# Altium footprint library Lib_001.PcbLib: 429 footprints (part 25 of 28)
Each footprint in its own frame and in the unit in brackets; x right, y up, seen from the top. Pads: shape width x height; smd on the part's side, far side on the other; paste and mask are expansions set on the pad; w line width, h text height; cw(c..) or ccw(c..) is an arc to the next point about the centre after c.
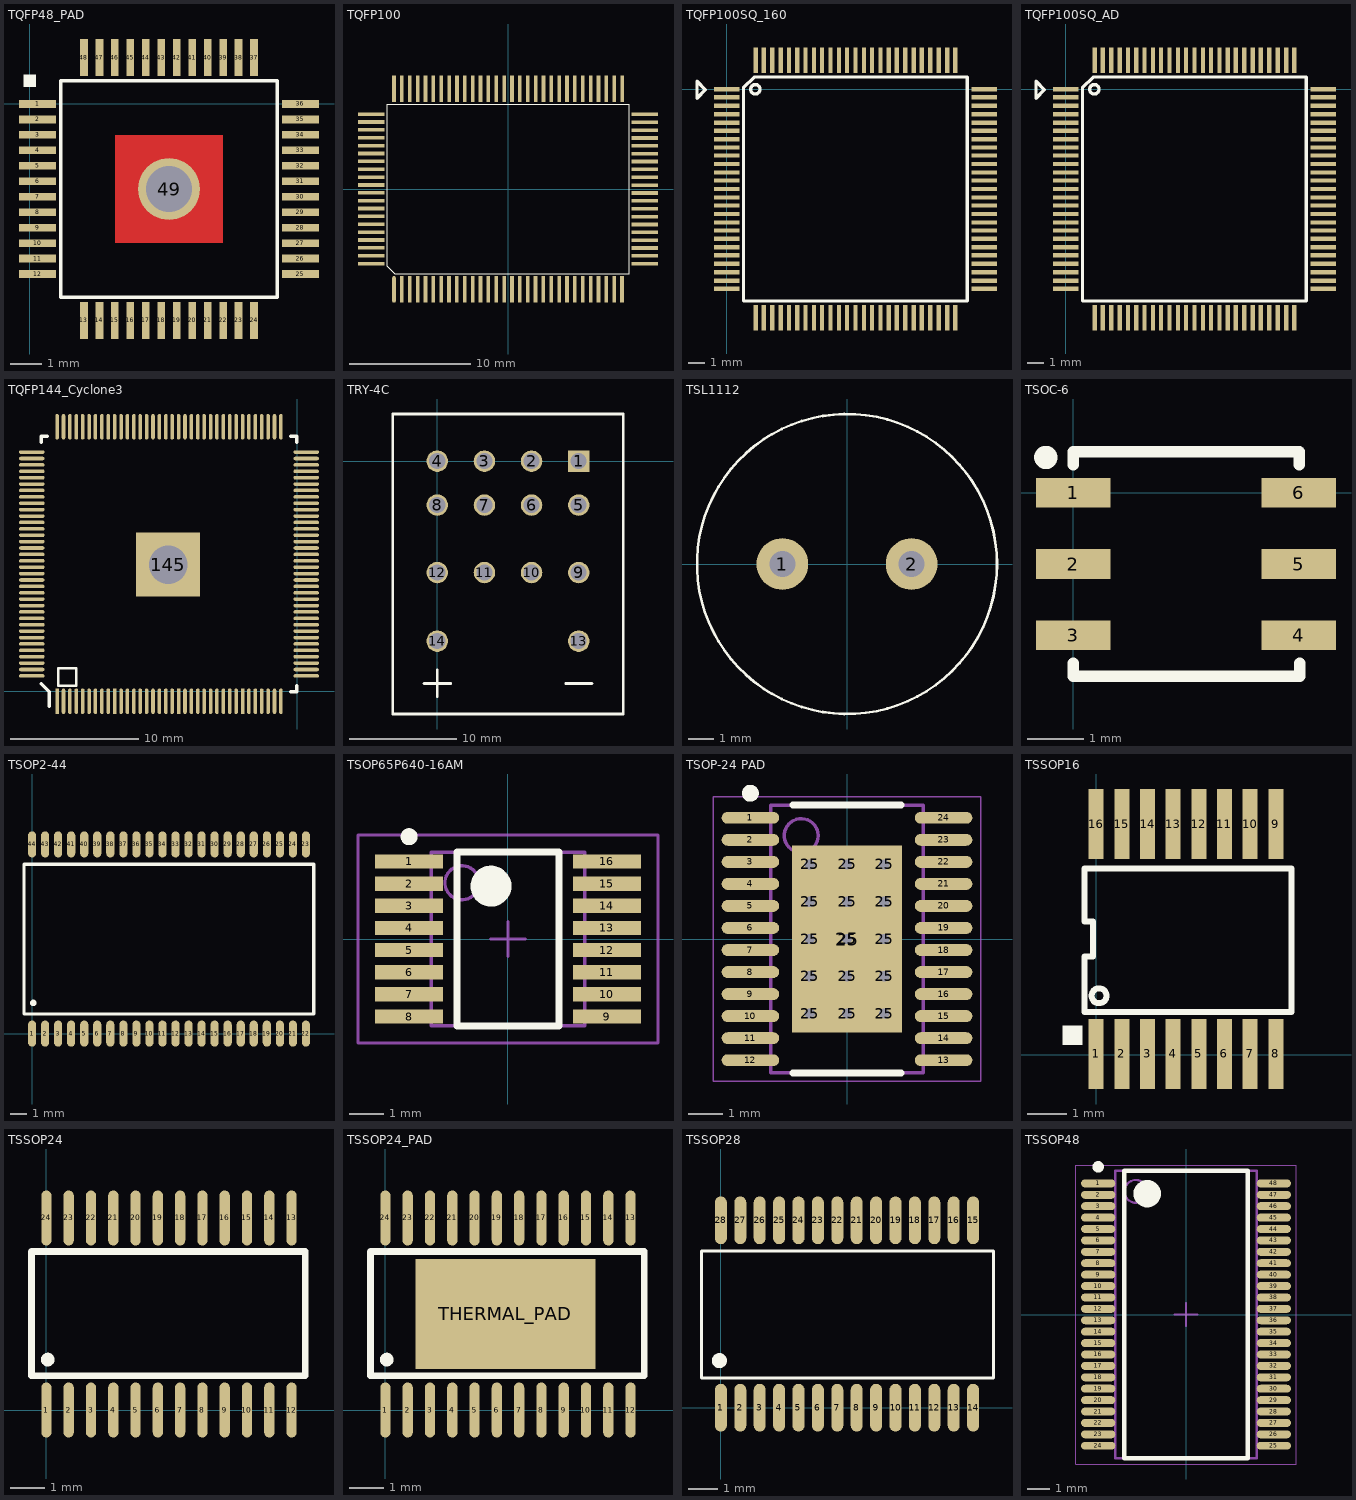
[diagram p24: the footprints below, top view; thin cyan lines are the x and y axes]

## TQFP48_PAD [mm] "TQFP 48 Leads with Exposed Pad"
height 1.2
pads (49):
  rect 1.2x0.25 smd: 1(0.25,0) 2(0.25,-0.5) 3(0.25,-1) 4(0.25,-1.5) 5(0.25,-2) 6(0.25,-2.5) 7(0.25,-3) 8(0.25,-3.5) 9(0.25,-4) 10(0.25,-4.5) 11(0.25,-5) 12(0.25,-5.5) 25(8.75,-5.5) 26(8.75,-5) 27(8.75,-4.5) 28(8.75,-4) 29(8.75,-3.5) 30(8.75,-3) 31(8.75,-2.5) 32(8.75,-2) 33(8.75,-1.5) 34(8.75,-1) 35(8.75,-0.5) 36(8.75,0)
  rect 0.25x1.2 smd: 13(1.75,-7) 14(2.25,-7) 15(2.75,-7) 16(3.25,-7) 17(3.75,-7) 18(4.25,-7) 19(4.75,-7) 20(5.25,-7) 21(5.75,-7) 22(6.25,-7) 23(6.75,-7) 24(7.25,-7) 37(7.25,1.5) 38(6.75,1.5) 39(6.25,1.5) 40(5.75,1.5) 41(5.25,1.5) 42(4.75,1.5) 43(4.25,1.5) 44(3.75,1.5) 45(3.25,1.5) 46(2.75,1.5) 47(2.25,1.5) 48(1.75,1.5)
  round 2 hole 1.5: 49(4.5,-2.75)
Top Layer:
  rectangle: 2.75,-4.5 6.25,-1
Top Overlay:
  rectangle: -0.2,0.55 0.2,0.95
  lines w0.1: 1,-6.25 1,0.75 8,0.75 8,-6.25 1,-6.25
3D body "TQFP48_PAD.STEP": height 1.1, standoff 0, extent 0,-7.25 9,1.75

## TQFP100 [mm]
pads (100):
  oval 0.3x2.2 smd: 1(-9.423,-8.3)
  rect 0.3x2.2 smd: 2(-8.773,-8.3) 3(-8.123,-8.3) 4(-7.473,-8.3) 5(-6.823,-8.3) 6(-6.173,-8.3) 7(-5.523,-8.3) 8(-4.873,-8.3) 9(-4.223,-8.3) 10(-3.573,-8.3) 11(-2.923,-8.3) 12(-2.273,-8.3) 13(-1.623,-8.3) 14(-0.973,-8.3) 15(-0.323,-8.3) 16(0.327,-8.3) 17(0.977,-8.3) 18(1.627,-8.3) 19(2.277,-8.3) 20(2.927,-8.3) 21(3.577,-8.3) 22(4.227,-8.3) 23(4.877,-8.3) 24(5.527,-8.3) 25(6.177,-8.3) 26(6.827,-8.3) 27(7.477,-8.3) 28(8.127,-8.3) 29(8.777,-8.3) 30(9.427,-8.3) 51(9.43,8.3) 52(8.78,8.3) 53(8.13,8.3) 54(7.48,8.3) 55(6.83,8.3) 56(6.18,8.3) 57(5.53,8.3) 58(4.88,8.3) 59(4.23,8.3) 60(3.58,8.3) 61(2.93,8.3) 62(2.28,8.3) 63(1.63,8.3) 64(0.98,8.3) 65(0.33,8.3) 66(-0.32,8.3) 67(-0.97,8.3) 68(-1.62,8.3) 69(-2.27,8.3) 70(-2.92,8.3) 71(-3.57,8.3) 72(-4.22,8.3) 73(-4.87,8.3) 74(-5.52,8.3) 75(-6.17,8.3) 76(-6.82,8.3) 77(-7.47,8.3) 78(-8.12,8.3) 79(-8.77,8.3) 80(-9.42,8.3)
  rect 2.2x0.3 smd: 31(11.3,-6.18) 32(11.3,-5.53) 33(11.3,-4.88) 34(11.3,-4.23) 35(11.3,-3.58) 36(11.3,-2.93) 37(11.3,-2.28) 38(11.3,-1.63) 39(11.3,-0.98) 40(11.3,-0.33) 41(11.3,0.32) 42(11.3,0.97) 43(11.3,1.62) 44(11.3,2.27) 45(11.3,2.92) 46(11.3,3.57) 47(11.3,4.22) 48(11.3,4.87) 49(11.3,5.52) 50(11.3,6.17) 81(-11.3,6.185) 82(-11.3,5.535) 83(-11.3,4.885) 84(-11.3,4.235) 85(-11.3,3.585) 86(-11.3,2.935) 87(-11.3,2.285) 88(-11.3,1.635) 89(-11.3,0.985) 90(-11.3,0.335) 91(-11.3,-0.315) 92(-11.3,-0.965) 93(-11.3,-1.615) 94(-11.3,-2.265) 95(-11.3,-2.915) 96(-11.3,-3.565) 97(-11.3,-4.215) 98(-11.3,-4.865) 99(-11.3,-5.515) 100(-11.3,-6.165)
Top Overlay:
  lines w0.1: 10.018,-7.01 -9.373,-7.01 -9.982,-6.401 -9.982,7.014 10.018,7.014 ; 10.027,-7.01 10.027,7.008
3D body "SW3dPS-QFP-100.STEP": height 3.45, standoff -0.08, extent -11.59,-8.6 11.61,8.6

## TQFP100SQ_160 [mil]
pads (100):
  rect 60x10 smd: 1(0,0) 2(0,-19) 3(0,-39) 4(0,-59) 5(0,-79) 6(0,-98) 7(0,-118) 8(0,-138) 9(0,-157) 10(0,-177) 11(0,-197) 12(0,-216) 13(0,-236) 14(0,-256) 15(0,-275) 16(0,-295) 17(0,-315) 18(0,-334) 19(0,-354) 20(0,-374) 21(0,-393) 22(0,-413) 23(0,-433) 24(0,-453) 25(0,-472) 51(610,-472) 52(610,-453) 53(610,-433) 54(610,-413) 55(610,-393) 56(610,-374) 57(610,-354) 58(610,-334) 59(610,-315) 60(610,-295) 61(610,-275) 62(610,-256) 63(610,-236) 64(610,-216) 65(610,-197) 66(610,-177) 67(610,-157) 68(610,-138) 69(610,-118) 70(610,-98) 71(610,-79) 72(610,-59) 73(610,-39) 74(610,-19) 75(610,0)
  rect 10x60 smd: 26(69,-541) 27(88,-541) 28(108,-541) 29(128,-541) 30(148,-541) 31(167,-541) 32(187,-541) 33(207,-541) 34(226,-541) 35(246,-541) 36(266,-541) 37(285,-541) 38(305,-541) 39(325,-541) 40(344,-541) 41(364,-541) 42(384,-541) 43(403,-541) 44(423,-541) 45(443,-541) 46(462,-541) 47(482,-541) 48(502,-541) 49(522,-541) 50(541,-541) 76(541,69) 77(522,69) 78(502,69) 79(482,69) 80(462,69) 81(443,69) 82(423,69) 83(403,69) 84(384,69) 85(364,69) 86(344,69) 87(325,69) 88(305,69) 89(285,69) 90(266,69) 91(246,69) 92(226,69) 93(207,69) 94(187,69) 95(167,69) 96(148,69) 97(128,69) 98(108,69) 99(88,69) 100(69,69)
Top Overlay:
  circle w8: c68,0 r11.18
  lines w8: -70,-21 -70,19 -50,-1 -70,-21 ; 40,-501 570,-501 570,29 65,29 40,4 40,-501
3D body "User Library-TQFP100_Grid_0_5.STEP": height 47.24, standoff 0.03, extent -10.63,-550 619.29,79.92

## TQFP100SQ_AD [mil]
pads (100):
  rect 60x10 smd: 1(0,0) 2(0,-19) 3(0,-39) 4(0,-59) 5(0,-79) 6(0,-98) 7(0,-118) 8(0,-138) 9(0,-157) 10(0,-177) 11(0,-197) 12(0,-216) 13(0,-236) 14(0,-256) 15(0,-275) 16(0,-295) 17(0,-315) 18(0,-334) 19(0,-354) 20(0,-374) 21(0,-393) 22(0,-413) 23(0,-433) 24(0,-453) 25(0,-472) 51(610,-472) 52(610,-453) 53(610,-433) 54(610,-413) 55(610,-393) 56(610,-374) 57(610,-354) 58(610,-334) 59(610,-315) 60(610,-295) 61(610,-275) 62(610,-256) 63(610,-236) 64(610,-216) 65(610,-197) 66(610,-177) 67(610,-157) 68(610,-138) 69(610,-118) 70(610,-98) 71(610,-79) 72(610,-59) 73(610,-39) 74(610,-19) 75(610,0)
  rect 10x60 smd: 26(69,-541) 27(88,-541) 28(108,-541) 29(128,-541) 30(148,-541) 31(167,-541) 32(187,-541) 33(207,-541) 34(226,-541) 35(246,-541) 36(266,-541) 37(285,-541) 38(305,-541) 39(325,-541) 40(344,-541) 41(364,-541) 42(384,-541) 43(403,-541) 44(423,-541) 45(443,-541) 46(462,-541) 47(482,-541) 48(502,-541) 49(522,-541) 50(541,-541) 76(541,69) 77(522,69) 78(502,69) 79(482,69) 80(462,69) 81(443,69) 82(423,69) 83(403,69) 84(384,69) 85(364,69) 86(344,69) 87(325,69) 88(305,69) 89(285,69) 90(266,69) 91(246,69) 92(226,69) 93(207,69) 94(187,69) 95(167,69) 96(148,69) 97(128,69) 98(108,69) 99(88,69) 100(69,69)
Top Overlay:
  circle w8: c68,0 r11.18
  lines w8: -70,-21 -50,-1 -70,19 -70,-21 ; 40,-501 40,4 65,29 570,29 570,-501 40,-501
3D body "ADATE206.STEP": height 45.28, standoff 0, extent -9.83,-551.17 620.09,78.75

## TQFP144_Cyclone3 [mil]
pads (145):
  rect 11x78.73 smd: 1(-739.47,-31.47) 10(-562.17,-31.47) 20(-365.17,-31.47) 30(-168.17,-31.47)
  oval 11x78.73 smd: 2(-719.77,-31.47) 3(-700.07,-31.47) 4(-680.37,-31.47) 5(-660.67,-31.47) 6(-640.97,-31.47) 7(-621.27,-31.47) 8(-601.57,-31.47) 9(-581.87,-31.47) 11(-542.47,-31.47) 12(-522.77,-31.47) 13(-503.07,-31.47) 14(-483.37,-31.47) 15(-463.67,-31.47) 16(-443.97,-31.47) 17(-424.27,-31.47) 18(-404.57,-31.47) 19(-384.87,-31.47) 21(-345.47,-31.47) 22(-325.77,-31.47) 23(-306.07,-31.47) 24(-286.37,-31.47) 25(-266.67,-31.47) 26(-246.97,-31.47) 27(-227.27,-31.47) 28(-207.57,-31.47) 29(-187.87,-31.47) 31(-148.47,-31.47) 32(-128.77,-31.47) 33(-109.07,-31.47) 34(-89.37,-31.47) 35(-69.67,-31.47) 36(-49.97,-31.47) 73(-49.97,814.03) 74(-69.67,814.03) 75(-89.37,814.03) 76(-109.07,814.03) 77(-128.77,814.03) 78(-148.47,814.03) 79(-168.17,814.03) 80(-187.87,814.03) 81(-207.57,814.03) 82(-227.27,814.03) 83(-246.97,814.03) 84(-266.67,814.03) 85(-286.37,814.03) 86(-306.07,814.03) 87(-325.77,814.03) 88(-345.47,814.03) 89(-365.17,814.03) 90(-384.87,814.03) 91(-404.57,814.03) 92(-424.27,814.03) 93(-443.97,814.03) 94(-463.67,814.03) 95(-483.37,814.03) 96(-503.07,814.03) 97(-522.77,814.03) 98(-542.47,814.03) 99(-562.17,814.03) 100(-581.87,814.03) 101(-601.57,814.03) 102(-621.27,814.03) 103(-640.97,814.03) 104(-660.67,814.03) 105(-680.37,814.03) 106(-700.07,814.03) 107(-719.77,814.03) 108(-739.47,814.03)
  oval 78.73x11 smd: 37(28.03,46.53) 38(28.03,66.23) 39(28.03,85.93) 40(28.03,105.63) 41(28.03,125.33) 42(28.03,145.03) 43(28.03,164.73) 44(28.03,184.43) 45(28.03,204.13) 46(28.03,223.83) 47(28.03,243.53) 48(28.03,263.23) 49(28.03,282.93) 50(28.03,302.63) 51(28.03,322.33) 52(28.03,342.03) 53(28.03,361.73) 54(28.03,381.43) 55(28.03,401.13) 56(28.03,420.83) 57(28.03,440.53) 58(28.03,460.23) 59(28.03,479.93) 60(28.03,499.63) 61(28.03,519.33) 62(28.03,539.03) 63(28.03,558.73) 64(28.03,578.43) 65(28.03,598.13) 66(28.03,617.83) 67(28.03,637.53) 68(28.03,657.23) 69(28.03,676.93) 70(28.03,696.63) 71(28.03,716.33) 72(28.03,736.03) 109(-817.47,736.03) 110(-817.47,716.33) 111(-817.47,696.63) 112(-817.47,676.93) 113(-817.47,657.23) 114(-817.47,637.53) 115(-817.47,617.83) 116(-817.47,598.13) 117(-817.47,578.43) 118(-817.47,558.73) 119(-817.47,539.03) 120(-817.47,519.33) 121(-817.47,499.63) 122(-817.47,479.93) 123(-817.47,460.23) 124(-817.47,440.53) 125(-817.47,420.83) 126(-817.47,401.13) 127(-817.47,381.43) 128(-817.47,361.73) 129(-817.47,342.03) 130(-817.47,322.33) 131(-817.47,302.63) 132(-817.47,282.93) 133(-817.47,263.23) 134(-817.47,243.53) 135(-817.47,223.83) 136(-817.47,204.13) 137(-817.47,184.43) 138(-817.47,164.73) 139(-817.47,145.03) 140(-817.47,125.33) 141(-817.47,105.63) 142(-817.47,85.93) 143(-817.47,66.23) 144(-817.47,46.53)
  rect 196.83x196.83 hole 118.11: 145(-397.27,389.4)
Top Overlay:
  lines w7.87: -735.53,51.13 -735.53,70.8 -680.47,70.8 -680.47,15.73 -735.53,15.73 -735.53,55.07
  lines w10: -788.47,22.53 -763.47,-2.47 -763.47,-47.2 ; -788.47,766.23 -788.47,785.03 -769.77,785.03 ; -19.77,-2.47 -0.97,-2.47 -0.97,16.23 ; -19.77,785.03 -0.97,785.03 -0.97,766.23
Mechanical 3:
  lines w4: -407.27,391.23 ccw(c-394.77,391.23) -394.77,378.73 ccw(c-394.77,391.23) -382.27,391.23 ccw(c-394.77,391.23) -394.77,403.73 ccw(c-394.77,391.23) -407.27,391.23
3D body "EQFP144.STEP": height 66.93, standoff 0, extent -827.96,-42.13 38.18,824.02

## TRY-4C [mm]
height 35.5
pads (14):
  rect 2x2 hole 1.5: 1(13.2,0)
  round 2 hole 1.5: 2(8.8,0) 3(4.4,0) 4(0,0) 5(13.2,-4.1) 6(8.8,-4.1) 7(4.4,-4.1) 8(0,-4.1) 9(13.2,-10.4) 10(8.8,-10.4) 11(4.4,-10.4) 12(0,-10.4) 13(13.2,-16.8) 14(0,-16.8)
Top Overlay:
  lines w0.254: -1.25,-20.75 1.25,-20.75 ; 0,-22 0,-19.5 ; 12,-20.75 14.45,-20.75 ; -4.15,-23.6 -4.15,4.4 17.35,4.4 17.35,-23.6 -4.15,-23.6

## TSL1112 [mm]
height 12.5
pads (2):
  round 2 hole 1: 1(-2.5,0) 2(2.5,0)
Top Overlay:
  circle w0.1: c0,0 r5.8
3D body: height 0.2, standoff -3, extent 2.173,-0.329 2.83,0.33
3D body: height 0.2, standoff -3, extent -2.827,-0.329 -2.17,0.33
3D body: height 12.5, standoff 0, extent -5.556,-5.589 5.6,5.589

## TSOC-6 [mm]
pads (6):
  rect 1.33x0.53 smd: 1(0,0) 2(0,-1.27) 3(0,-2.54) 4(4.02,-2.54) 5(4.02,-1.27) 6(4.02,0)
Top Overlay:
  circle w0.254: c-0.49,0.63 r0.081
  lines w0.2: 0,-3.04 0,-3.27 4.04,-3.27 4.04,-3.04 ; 0,0.5 0,0.73 4.03,0.73 4.03,0.5
3D body "SW3dPS-TSOC6.STEP": height 1.4, standoff 0, extent -0.085,-3.27 4.115,0.73

## TSOP2-44 [mm]
pads (44):
  oval 0.5x1.6 smd: 1(0,0) 2(0.8,0) 3(1.6,0) 4(2.4,0) 5(3.2,0) 6(4,0) 7(4.8,0) 8(5.6,0) 9(6.4,0) 10(7.2,0) 11(8,0) 12(8.8,0) 13(9.6,0) 14(10.4,0) 15(11.2,0) 16(12,0) 17(12.8,0) 18(13.6,0) 19(14.4,0) 20(15.2,0) 21(16,0) 22(16.8,0) 23(16.8,11.6) 24(16,11.6) 25(15.2,11.6) 26(14.4,11.6) 27(13.6,11.6) 28(12.8,11.6) 29(12,11.6) 30(11.2,11.6) 31(10.4,11.6) 32(9.6,11.6) 33(8.8,11.6) 34(8,11.6) 35(7.2,11.6) 36(6.4,11.6) 37(5.6,11.6) 38(4.8,11.6) 39(4,11.6) 40(3.2,11.6) 41(2.4,11.6) 42(1.6,11.6) 43(0.8,11.6) 44(0,11.6)
Top Overlay:
  circle w0.2: c0.076,1.88 r0.1
  lines w0.2: -0.491,1.194 17.272,1.194 17.272,10.386 5.502,10.386 1.507,10.386 -0.491,10.386 -0.491,1.194
3D body "SW3dPS-TSOP2-44.STEP": height 1.3, standoff -0.4, extent -0.75,-0.01 17.46,11.75

## TSOP65P640-16AM [mm] "TSOP, 16-Leads, Body 5x4.4mm, Pitch 0.65mm, IPC Low Density"
height 1.1
pads (16):
  rect 2x0.42 smd: 1(-2.9,2.275) 2(-2.9,1.625) 3(-2.9,0.975) 4(-2.9,0.325) 5(-2.9,-0.325) 6(-2.9,-0.975) 7(-2.9,-1.625) 8(-2.9,-2.275) 9(2.9,-2.275) 10(2.9,-1.625) 11(2.9,-0.975) 12(2.9,-0.325) 13(2.9,0.325) 14(2.9,0.975) 15(2.9,1.625) 16(2.9,2.275)
Top Overlay:
  circle w0.6: c-0.5,1.55 r0.3
  circle w0.25: c-2.9,3 r0.125
  lines w0.2: -1.5,-2.55 1.5,-2.55 1.5,2.55 -1.5,2.55 -1.5,-2.55
Mechanical 13:
  circle w0.1: c-1.35,1.65 r0.5
  lines w0.1: -2.25,-2.55 2.25,-2.55 2.25,2.55 -2.25,2.55 -2.25,-2.55
Mechanical 15:
  lines w0.1: -0.5,0 0.5,0 ; 0,-0.5 0,0.5 ; -4.4,-3.05 4.4,-3.05 4.4,3.05 -4.4,3.05 -4.4,-3.05
3D body "User Library-TSSOP-16-1.step": height 1.1, standoff 0, extent -3.2,-2.51 3.2,2.49

## TSOP-24 PAD [mm] "TSOP, 24-Leads, Body 7.8x4.4mm, Pitch 0.65mm, Thermal pad 5.02x3.25 mm, IPC Medium Density"
height 1.2
pads (40):
  oval 1.7x0.35 smd: 1(-2.85,3.575) 2(-2.85,2.925) 3(-2.85,2.275) 4(-2.85,1.625) 5(-2.85,0.975) 6(-2.85,0.325) 7(-2.85,-0.325) 8(-2.85,-0.975) 9(-2.85,-1.625) 10(-2.85,-2.275) 11(-2.85,-2.925) 12(-2.85,-3.575) 13(2.85,-3.575) 14(2.85,-2.925) 15(2.85,-2.275) 16(2.85,-1.625) 17(2.85,-0.975) 18(2.85,-0.325) 19(2.85,0.325) 20(2.85,0.975) 21(2.85,1.625) 22(2.85,2.275) 23(2.85,2.925) 24(2.85,3.575)
  round 0.7 hole 0.3: 25(-1.1,-2.2) 25(-1.1,-1.1) 25(-1.1,0) 25(-1.1,1.1) 25(-1.1,2.2) 25(0,-2.2) 25(0,-1.1) 25(0,0) 25(0,1.1) 25(0,2.2) 25(1.1,-2.2) 25(1.1,-1.1) 25(1.1,0) 25(1.1,1.1) 25(1.1,2.2)
  rect 3.25x5.52 smd: 25(0,0)
Top Overlay:
  circle w0.25: c-2.85,4.3 r0.125
  lines w0.2: -1.6,-3.95 1.6,-3.95 ; -1.6,3.95 1.6,3.95
Mechanical 13:
  circle w0.1: c-1.35,3.05 r0.5
  lines w0.1: -2.25,-3.95 2.25,-3.95 2.25,3.95 -2.25,3.95 -2.25,-3.95
Mechanical 15:
  lines w0.05: -3.95,-4.2 3.95,-4.2 3.95,4.2 -3.95,4.2 -3.95,-4.2
  lines w0.1: -0.5,0 0.5,0 ; 0,-0.5 0,0.5
3D body: height 1.2, standoff 0.05, extent -2.25,-3.95 2.25,3.95

## TSSOP16 [mil]
pads (16):
  rect 15x70 smd: 1(0,1) 2(25.59,1) 3(51.18,1) 4(76.77,1) 5(102.36,1) 6(127.95,1) 7(153.54,1) 8(179.13,1) 9(179.13,230.31) 10(153.54,230.31) 11(127.95,230.31) 12(102.36,230.31) 13(76.77,230.31) 14(51.18,230.31) 15(25.59,230.31) 16(0,230.31)
Top Overlay:
  circle w6: c2.87,59 r7.43
  rectangle: -33.46,9.84 -13.78,29.53
  lines w6: -11.81,43 194.88,43 194.88,185.94 -11.81,185.94 -11.81,133 -3.13,133 -3.13,98 -11.81,98 -11.81,43
Mechanical 3:
  text "JW" at -31.33,-37 h37.5
3D body "TSSOP16.STEP": height 43.31, standoff 0, extent -9.64,-11.81 189.17,244.09

## TSSOP24 [mm]
pads (24):
  oval 0.3x1.6 smd: 1(0,0) 2(0.65,0) 3(1.3,0) 4(1.95,0) 5(2.6,0) 6(3.25,0) 7(3.9,0) 8(4.55,0) 9(5.2,0) 10(5.85,0) 11(6.5,0) 12(7.15,0) 13(7.15,5.6) 14(6.5,5.6) 15(5.85,5.6) 16(5.2,5.6) 17(4.55,5.6) 18(3.9,5.6) 19(3.25,5.6) 20(2.6,5.6) 21(1.95,5.6) 22(1.3,5.6) 23(0.65,5.6) 24(0,5.6)
Top Overlay:
  circle w0.2: c0.04,1.47 r0.1
  lines w0.2: -0.44,1 -0.44,4.62 7.55,4.62 7.55,1 -0.44,1
3D body "User Library-User Library-TSSOP-24.step": height 1.2, standoff 0, extent -0.382,-0.478 7.518,6.072

## TSSOP24_PAD [mm]
pads (25):
  oval 0.3x1.6 smd: 1(0,0) 2(0.65,0) 3(1.3,0) 4(1.95,0) 5(2.6,0) 6(3.25,0) 7(3.9,0) 8(4.55,0) 9(5.2,0) 10(5.85,0) 11(6.5,0) 12(7.15,0) 13(7.15,5.6) 14(6.5,5.6) 15(5.85,5.6) 16(5.2,5.6) 17(4.55,5.6) 18(3.9,5.6) 19(3.25,5.6) 20(2.6,5.6) 21(1.95,5.6) 22(1.3,5.6) 23(0.65,5.6) 24(0,5.6)
  rect 5.26x3.2 smd: THERMAL_PAD(3.5,2.8)
Top Overlay:
  circle w0.2: c0.04,1.47 r0.1
  lines w0.2: -0.44,1 7.55,1 7.55,4.62 -0.44,4.62 -0.44,1
3D body "User Library-User Library-TSSOP-24.step": height 1.2, standoff 0, extent -0.4,-0.485 7.5,6.065

## TSSOP28 [mm]
pads (28):
  oval 0.4x1.6 smd: 1(0,0) 2(0.65,0) 3(1.3,0) 4(1.95,0) 5(2.6,0) 6(3.25,0) 7(3.9,0) 8(4.55,0) 9(5.2,0) 10(5.85,0) 11(6.5,0) 12(7.15,0) 13(7.8,0) 14(8.45,0) 15(8.45,6.275) 16(7.8,6.275) 17(7.15,6.275) 18(6.5,6.275) 19(5.85,6.275) 20(5.2,6.275) 21(4.55,6.275) 22(3.9,6.275) 23(3.25,6.275) 24(2.6,6.275) 25(1.95,6.275) 26(1.3,6.275) 27(0.65,6.275) 28(0,6.275)
Top Overlay:
  circle w0.254: c-0.05,1.575 r0.125
  lines w0.1: -0.65,1 9.125,1 9.125,5.25 -0.65,5.25 -0.65,1
3D body "User Library-TSSOP-28_P065.STEP": height 1.02, standoff 0.03, extent -0.625,-0.1 9.075,6.3

## TSSOP48 [mm] "TSSOP, 48-Leads, Body 12,60x6,20mm, Pitch 0,50mm, IPC Medium Density"
height 1.2
pads (48):
  oval 1.5x0.35 smd: 1(-3.85,5.75) 2(-3.85,5.25) 3(-3.85,4.75) 4(-3.85,4.25) 5(-3.85,3.75) 6(-3.85,3.25) 7(-3.85,2.75) 8(-3.85,2.25) 9(-3.85,1.75) 10(-3.85,1.25) 11(-3.85,0.75) 12(-3.85,0.25) 13(-3.85,-0.25) 14(-3.85,-0.75) 15(-3.85,-1.25) 16(-3.85,-1.75) 17(-3.85,-2.25) 18(-3.85,-2.75) 19(-3.85,-3.25) 20(-3.85,-3.75) 21(-3.85,-4.25) 22(-3.85,-4.75) 23(-3.85,-5.25) 24(-3.85,-5.75) 25(3.85,-5.75) 26(3.85,-5.25) 27(3.85,-4.75) 28(3.85,-4.25) 29(3.85,-3.75) 30(3.85,-3.25) 31(3.85,-2.75) 32(3.85,-2.25) 33(3.85,-1.75) 34(3.85,-1.25) 35(3.85,-0.75) 36(3.85,-0.25) 37(3.85,0.25) 38(3.85,0.75) 39(3.85,1.25) 40(3.85,1.75) 41(3.85,2.25) 42(3.85,2.75) 43(3.85,3.25) 44(3.85,3.75) 45(3.85,4.25) 46(3.85,4.75) 47(3.85,5.25) 48(3.85,5.75)
Top Overlay:
  circle w0.6: c-1.7,5.3 r0.3
  circle w0.25: c-3.85,6.475 r0.125
  lines w0.2: -2.7,-6.3 2.7,-6.3 2.7,6.3 -2.7,6.3 -2.7,-6.3
Mechanical 13:
  circle w0.1: c-2.2,5.4 r0.5
  lines w0.1: -3.1,-6.3 3.1,-6.3 3.1,6.3 -3.1,6.3 -3.1,-6.3
Mechanical 15:
  lines w0.05: -4.825,-6.55 4.825,-6.55 4.825,6.55 -4.825,6.55 -4.825,-6.55
  lines w0.1: -0.5,0 0.5,0 ; 0,-0.5 0,0.5
3D body "SW3dPS-TSSOP-48.STEP": height 1.1, standoff 0, extent -4.05,-6.2 4.05,6.3